# Altium integrated library Electro-Mech.IntLib: 140 symbols
Pins are listed as number, name and electrical type; pins without a type are passive.

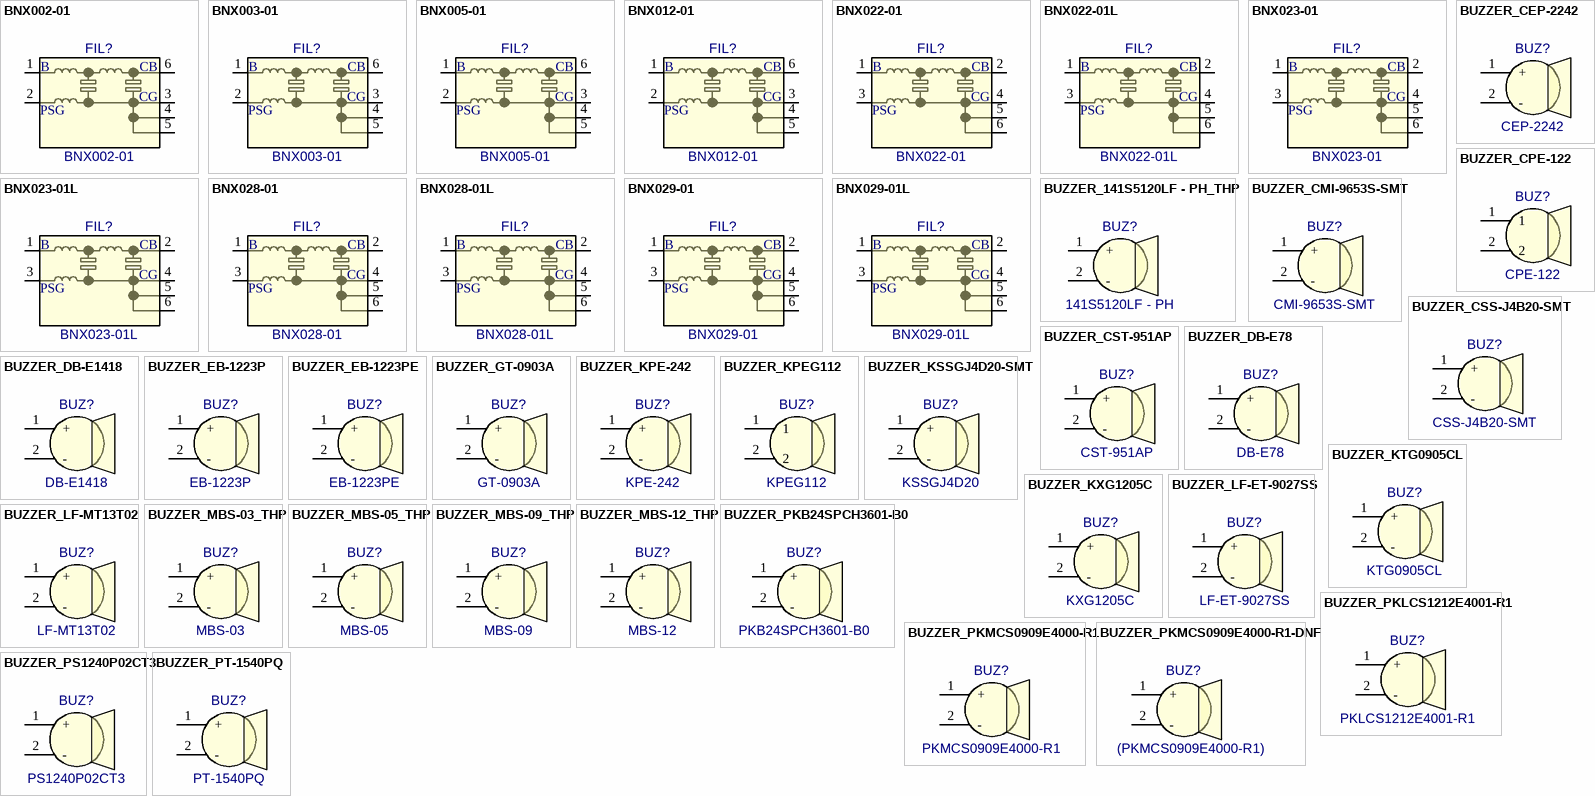
[diagram p0: symbols BNX002-01 to BUZZER_PT-1540PQ]

## BNX002-01
designator FIL?
DC Power Filter 10Amp; Manufacturer: Murata; Reutech PN: 5915-GA-0027; Package: Fil-BNX; EDM-PN: *; Text2: *; Text1: *; Value: BNX002-01; Part Number: BNX002-01
footprint Fil-BNX (Filter BNX 12.0x11.0mm)
pins: 1, 2, 3, 4, 5, 6
text: B; CB; CG; PSG

## BNX003-01
designator FIL?
DC Power Filter 10Amp; Manufacturer: Murata; Package: Fil-BNX; EDM-PN: *; Text2: *; Text1: *; Value: BNX003-01; Part Number: BNX003-01
footprint Fil-BNX (Filter BNX 12.0x11.0mm)
pins: 1, 2, 3, 4, 5, 6
text: B; CB; CG; PSG

## BNX005-01
designator FIL?
DC Power Filter 15Amp; Manufacturer: Murata; Reutech PN: 5915-GA-0071; Package: Fil-BNX; EDM-PN: *; Text2: *; Text1: *; Value: BNX005-01; Part Number: BNX005-01
footprint Fil-BNX (Filter BNX 12.0x11.0mm)
pins: 1, 2, 3, 4, 5, 6
text: B; CB; CG; PSG

## BNX012-01
designator FIL?
DC Power Filter 15Amp 50V; Manufacturer: Murata; Reutech PN: 5915-GA-0076; Package: Fil-BNX012; EDM-PN: *; Text2: *; Text1: *; Value: BNX012-01; Part Number: BNX012-01
footprint Fil-BNX012 (Filter BNX 12.0x11.0mm)
pins: 1, 2, 3, 4, 5, 6
text: B; CB; CG; PSG

## BNX022-01
designator FIL?
DC Power Filter 20Amp 50V; Manufacturer: Murata; Package: BNX02X; EDM-PN: *; Text2: *; Text1: *; Value: BNX022-01; Part Number: BNX022-01
footprint BNX02X (BNX02X 12.1x9.1mm)
pins: 1, 2, 3, 4, 5, 6
text: B; CB; CG; PSG

## BNX022-01L
designator FIL?
DC Power Filter 20Amp 50V; Manufacturer: Murata; Reutech PN: 5915-GA-0069; Package: BNX02X; EDM-PN: *; Text2: *; Text1: *; Value: BNX022-01L; Part Number: BNX022-01L
footprint BNX02X (BNX02X 12.1x9.1mm)
pins: 1, 2, 3, 4, 5, 6
text: B; CB; CG; PSG

## BNX023-01
designator FIL?
DC Power Filter 20Amp 100V; Manufacturer: Murata; Package: BNX02X; EDM-PN: *; Text2: *; Text1: *; Value: BNX023-01; Part Number: BNX023-01
footprint BNX02X (BNX02X 12.1x9.1mm)
pins: 1, 2, 3, 4, 5, 6
text: B; CB; CG; PSG

## BNX023-01L
designator FIL?
DC Power Filter 20Amp 100V; Manufacturer: Murata; Package: BNX02X; EDM-PN: *; Text2: *; Text1: *; Value: BNX023-01L; Part Number: BNX023-01L
footprint BNX02X (BNX02X 12.1x9.1mm)
pins: 1, 2, 3, 4, 5, 6
text: B; CB; CG; PSG

## BNX028-01
designator FIL?
DC Power Filter 20Amp 16V; Manufacturer: Murata; Package: BNX02X; EDM-PN: *; Text2: *; Text1: *; Value: BNX028-01; Part Number: BNX028-01
footprint BNX02X (BNX02X 12.1x9.1mm)
pins: 1, 2, 3, 4, 5, 6
text: B; CB; CG; PSG

## BNX028-01L
designator FIL?
DC Power Filter 20Amp 16V; Manufacturer: Murata; Package: BNX02X; EDM-PN: *; Text2: *; Text1: *; Value: BNX028-01L; Part Number: BNX028-01L
footprint BNX02X (BNX02X 12.1x9.1mm)
pins: 1, 2, 3, 4, 5, 6
text: B; CB; CG; PSG

## BNX029-01
designator FIL?
DC Power Filter 20Amp 6.3V; Manufacturer: Murata; Reutech PN: 5915-GA-0085; Package: BNX02X; EDM-PN: *; Text2: *; Text1: *; Value: BNX029-01; Part Number: BNX029-01
footprint BNX02X (BNX02X 12.1x9.1mm)
pins: 1, 2, 3, 4, 5, 6
text: B; CB; CG; PSG

## BNX029-01L
designator FIL?
DC Power Filter 20Amp 6.3V; Manufacturer: Murata; Package: BNX02X; EDM-PN: *; Text2: *; Text1: *; Value: BNX029-01L; Part Number: BNX029-01L
footprint BNX02X (BNX02X 12.1x9.1mm)
pins: 1, 2, 3, 4, 5, 6
text: B; CB; CG; PSG

## BUZZER_141S5120LF - PH_THP
designator BUZ?, comment 141S5120LF - PH
Buzzer Magnetic 3-18V 8mA; Manufacturer: DB Products; Package: Buzzer-12x9.5mm; EDM-PN: *; Text2: *; Text1: *; Value: 141S5120LF - PH; Part Number: 141S5120LF - PH
footprint Buzzer-12x9.5mm (Buzzer 12.0x9.5mm 7.6mm Pitch)
pins: 1 +, 2 -

## BUZZER_CEP-2242
designator BUZ?, comment CEP-2242
Buzzer Piezo 3-16V 7mA; Manufacturer: CUI; Package: BUZZER-CEP-2242; EDM-PN: *; Text2: *; Text1: *; Value: CEP-2242; Part Number: CEP-2242
footprint BUZZER-CEP-2242 (CEP-2242 13.7x13.7mm)
pins: 1 +, 2 -

## BUZZER_CMI-9653S-SMT
designator BUZ?, comment CMI-9653S-SMT
Buzzer Magnetic 5V 30mA; Manufacturer: CUI; EDM-PN: BUZ25; Package: BUZZER-CMI-9653S-SMT; Text2: *; Text1: *; Value: CMI-9653S-SMT; Part Number: CMI-9653S-SMT
footprint BUZZER-CMI-9653S-SMT (CMI-9653S-SMT  9.6x9.6mm)
pins: 1 +, 2 -

## BUZZER_CPE-122
designator BUZ?, comment CPE-122
Buzzer Piezo 10V 8mA; Manufacturer: CUI; Package: Buzzer-CPE-122; EDM-PN: *; Text2: *; Text1: *; Value: CPE-122; Part Number: CPE-122
footprint Buzzer-CPE-122 (Buzzer CPE-122 10.0mm Pitch)
pins: 1, 2

## BUZZER_CSS-J4B20-SMT
designator BUZ?, comment CSS-J4B20-SMT
Buzzer Magnetic; Manufacturer: CUI; Package: BUZZER-CSS-J4B20-SMT; EDM-PN: *; Text2: *; Text1: *; Value: CSS-J4B20-SMT; Part Number: CSS-J4B20-SMT
footprint CSS-J4B20-SMT (Buzzer CSS-J4B20-SMT 8.5x8.5mm SMT)
pins: 1 +, 2 -

## BUZZER_CST-951AP
designator BUZ?, comment CST-951AP
Buzzer Magnetic 5V 80mA; Manufacturer: CUI; Package: Buzzer-9.0x4.5; EDM-PN: *; Text2: *; Text1: *; Value: CST-951AP; Part Number: CST-951AP
footprint Buzzer-9.0x4.5 (Buzzer 9.0x9.0mm)
pins: 1 +, 2 -

## BUZZER_DB-E78
designator BUZ?, comment DB-E78
Buzzer Piezo 24V 20mA - 7S3240LFLA; Manufacturer: Mantech; Package: BUZZER-29.5x24.5-THRU-PCB; EDM-PN: *; Text2: *; Text1: *; Value: DB-E78; Part Number: DB-E78
footprint BUZZER-29.5x24.5-THRU-PCB
pins: 1 +, 2 -

## BUZZER_DB-E1418
designator BUZ?, comment DB-E1418
Buzzer Magnetic 12V 8mA; Manufacturer: DB; Package: BUZZER-12x9.5mm; EDM-PN: *; Text2: *; Text1: *; Value: DB-E1418; Part Number: DB-E1418
footprint Buzzer-12x9.5mm (Buzzer 12.0x9.5mm 7.6mm Pitch)
pins: 1 +, 2 -

## BUZZER_EB-1223P
designator BUZ?, comment EB-1223P
Buzzer Magnetic 5V 30mA; Manufacturer: eBace/dBace; Package: BUZZER-12x9.5mm; EDM-PN: *; Text2: *; Text1: *; Value: EB-1223P; Part Number: EB-1223P
footprint Buzzer-12x9.5mm (Buzzer 12.0x9.5mm 7.6mm Pitch)
pins: 1 +, 2 -

## BUZZER_EB-1223PE
designator BUZ?, comment EB-1223PE
Buzzer Magnetic 12V 30mA; Manufacturer: eBace/dBace; Package: BUZZER-12x9.5mm; EDM-PN: *; Text2: *; Text1: *; Value: EB-1223PE; Part Number: EB-1223PE
footprint Buzzer-12x9.5mm (Buzzer 12.0x9.5mm 7.6mm Pitch)
pins: 1 +, 2 -

## BUZZER_GT-0903A
designator BUZ?, comment GT-0903A
Buzzer Magnetic 3V 80mA; Manufacturer: Soberton; Package: Buzzer-9.0x4.5; EDM-PN: *; Text2: *; Text1: *; Value: GT-0903A; Part Number: GT-0903A
footprint Buzzer-9.0x4.5 (Buzzer 9.0x9.0mm)
pins: 1 +, 2 -

## BUZZER_KPE-242
designator BUZ?, comment KPE-242
Buzzer Piezo 3-16V 7mA; Manufacturer: Kingstate; Package: BUZZER-KPE-242; EDM-PN: *; Text2: *; Text1: *; Value: KPE-242; Part Number: KPE-242
footprint BUZZER-KPE-242 (KPE-242 13.7x13.7mm)
pins: 1 +, 2 -

## BUZZER_KPEG112
designator BUZ?, comment KPEG112
Buzzer Piezo Max 30VAC 11mA; Manufacturer: Kingstate; Package: Buzzer-KPEG112; EDM-PN: *; Text2: *; Text1: *; Value: KPEG112; Part Number: KPEG112
footprint Buzzer-KPEG112 (Buzzer KPEG112 10.0mm Pitch)
pins: 1, 2

## BUZZER_KSSGJ4D20-SMT
designator BUZ?, comment KSSGJ4D20
Buzzer Magnetic; Manufacturer: Kingstate; Package: BUZZER-KSSGJ4D20; EDM-PN: *; Text2: *; Text1: *; Value: KSSGJ4D20; Part Number: KSSGJ4D20
footprint BUZZER-KSSGJ4D20 (Buzzer KSSGJ4D20 8.5x8.5mm SMT)
pins: 1 +, 2 -

## BUZZER_KTG0905CL
designator BUZ?, comment KTG0905CL
Buzzer Magnetic 5V 30mA; Manufacturer: Kingstate; Package: BUZZER-KTG0905CL; EDM-PN: *; Text2: *; Text1: *; Value: KTG0905CL; Part Number: KTG0905CL
footprint BUZZER-KTG0905CL (KTG0905CL  9.6x9.6mm)
pins: 1 +, 2 -

## BUZZER_KXG1205C
designator BUZ?, comment KXG1205C
Buzzer Magnetic 5V 30mA; Manufacturer: Kingstate; Package: BUZZER-12x9.5mm; EDM-PN: *; Text2: *; Text1: *; Value: KXG1205C; Part Number: KXG1205C
footprint Buzzer-12x9.5mm (Buzzer 12.0x9.5mm 7.6mm Pitch)
pins: 1 +, 2 -

## BUZZER_LF-ET-9027SS
designator BUZ?, comment LF-ET-9027SS
Buzzer 3V 80mA; Manufacturer: dBace Electronic; Package: BUZZER-LF-ET-9027SS; EDM-PN: *; Text2: *; Text1: *; Value: LF-ET-9027SS; Part Number: LF-ET-9027SS
footprint BUZZER-ET-9027SS (BUZZER-ET-9027SS 10.6x12.4mm)
pins: 1 +, 2 -

## BUZZER_LF-MT13T02
designator BUZ?, comment LF-MT13T02
Buzzer 5V 40mA; Manufacturer: Ariose Electonics; Package: BUZZER-LF-MT13T02; EDM-PN: *; Text2: *; Text1: *; Value: LF-MT13T02; Part Number: LF-MT13T02
footprint BUZZER-LF-MT13T02 (LF-MT13T02 12.8x12.8mm)
pins: 1 +, 2 -

## BUZZER_MBS-03_THP
designator BUZ?, comment MBS-03
Buzzer Magnetic 3V 30mA; Manufacturer: KAYER INDUSTRIAL; EDM-PN: BUZ1; Value: MBS-03_THP; Package: Buzzer-12x9.5mm; Text2: *; Text1: *; Part Number: MBS-03
footprint Buzzer-12x9.5mm (Buzzer 12.0x9.5mm 7.6mm Pitch)
pins: 1 +, 2 -

## BUZZER_MBS-05_THP
designator BUZ?, comment MBS-05
Buzzer Magnetic 5V 30mA; Manufacturer: KAYER INDUSTRIAL; Package: Buzzer-12x9.5mm; EDM-PN: *; Text2: *; Text1: *; Value: MBS-05; Part Number: MBS-05
footprint Buzzer-12x9.5mm (Buzzer 12.0x9.5mm 7.6mm Pitch)
pins: 1 +, 2 -

## BUZZER_MBS-09_THP
designator BUZ?, comment MBS-09
Buzzer Magnetic 9V 30mA; Manufacturer: KAYER INDUSTRIAL; Package: Buzzer-12x9.5mm; EDM-PN: *; Text2: *; Text1: *; Value: MBS-09; Part Number: MBS-09
footprint Buzzer-12x9.5mm (Buzzer 12.0x9.5mm 7.6mm Pitch)
pins: 1 +, 2 -

## BUZZER_MBS-12_THP
designator BUZ?, comment MBS-12
Buzzer Magnetic 12V 30mA; Manufacturer: KAYER INDUSTRIAL; Package: Buzzer-12x9.5mm; EDM-PN: *; Text2: *; Text1: *; Value: MBS-12; Part Number: MBS-12
footprint Buzzer-12x9.5mm (Buzzer 12.0x9.5mm 7.6mm Pitch)
pins: 1 +, 2 -

## BUZZER_PKB24SPCH3601-B0
designator BUZ?, comment PKB24SPCH3601-B0
Buzzer Piezoelectric 12V; Manufacturer: Murata; Package: PKB24SPCH3601-B0; EDM-PN: *; Text2: *; Text1: *; Value: PKB24SPCH3601-B0; Part Number: PKB24SPCH3601-B0
footprint PKB24SPCH3601-B0 (PKB24SPCH3601-B0 24.3mm)
pins: 1 +, 2 -

## BUZZER_PKLCS1212E4001-R1
designator BUZ?, comment PKLCS1212E4001-R1
Buzzer Piezoelectric; Manufacturer: Murata; Package: PKLCS1212E4001-R1; EDM-PN: *; Text2: *; Text1: *; Value: PKLCS1212E4001-R1; Part Number: PKLCS1212E4001-R1
footprint PKLCS1212E4001-R1 (Buzzer 12.0x12.0mm SMD)
pins: 1 +, 2 -

## BUZZER_PKMCS0909E4000-R1
designator BUZ?, comment Part Number: PKMCS0909E4000-R1  (hidden comment: PKLCS1212E4001-R1)
Buzzer Piezoelectric; Manufacturer: Murata; Value: PKMCS0909E4000-R1; Package: PKMCS0909E4000-R1; EDM-PN: *; Text2: *; Text1: *
footprint PKMCS0909E4000-R1 (Buzzer 9.0x9.0mm SMD)
pins: 1 +, 2 -

## BUZZER_PKMCS0909E4000-R1-DNF
designator BUZ?, comment value (PKMCS0909E4000-R1)  (hidden comment: PKLCS1212E4001-R1-DNF)
Buzzer Piezoelectric - Do not Fit; Manufacturer: Murata; Part Number: DNF - PKMCS0909E4000-R1; Package: PKMCS0909E4000-R1; EDM-PN: *; Text2: *; Text1: *
footprint PKMCS0909E4000-R1 (Buzzer 9.0x9.0mm SMD)
pins: 1 +, 2 -

## BUZZER_PS1240P02CT3
designator BUZ?, comment PS1240P02CT3
Buzzer Piezoelectric; Manufacturer: TDK; Package: PS1240P02CT3; EDM-PN: *; Text2: *; Text1: *; Value: PS1240P02CT3; Part Number: PS1240P02CT3
footprint PS1240P02CT3 (PS1240P02CT3 12.2x12.2mm)
pins: 1 +, 2 -

## BUZZER_PT-1540PQ
designator BUZ?, comment PT-1540PQ
Buzzer Piezo Transducer 5.0V; Manufacturer: Mallory; Package: Buzzer-PT-1540PQ; EDM-PN: *; Text2: *; Text1: *; Value: PT-1540PQ; Part Number: PT-1540PQ
footprint Buzzer-PT-1540PQ (PT-1540PQ 17.0x9.0mm 10mm Pitch)
pins: 1 +, 2 -

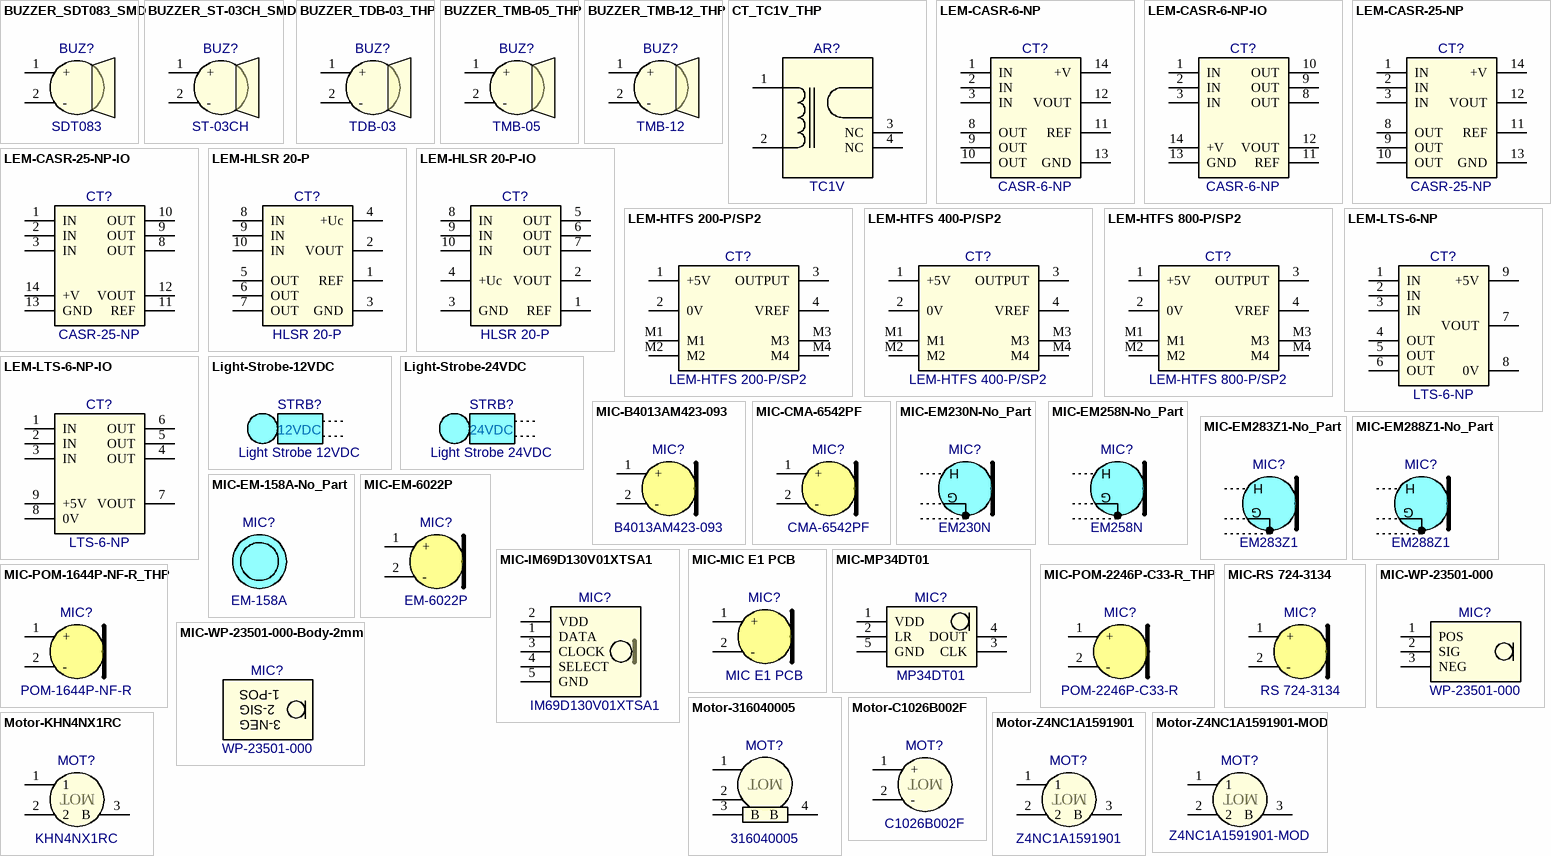
[diagram p1: symbols BUZZER_SDT083_SMD to Motor-Z4NC1A1591901-MOD]

## BUZZER_SDT083_SMD
designator BUZ?, comment SDT083
Magnetic Transducer; Manufacturer: DB Products; Package: BUZZER-SDT083; EDM-PN: *; Text2: *; Text1: *; Value: SDT083; Part Number: SDT083
footprint BUZZER-SDT083 (Buzzer SDT083 8.5x8.5mm SMT)
pins: 1 +, 2 -

## BUZZER_ST-03CH_SMD
designator BUZ?, comment ST-03CH
Magnetic Transducer; Manufacturer: Soberton; Package: BUZZER-ST-03CH; EDM-PN: *; Text2: *; Text1: *; Value: ST-03CH; Part Number: ST-03CH
footprint BUZZER-ST-03CH (Buzzer ST-03CH 8.5x8.5mm SMT)
pins: 1 +, 2 -

## BUZZER_TDB-03_THP
designator BUZ?, comment Part Number: TDB-03  (hidden comment: TDB-03PN)
Buzzer Magnetic; Manufacturer: Various; EDM-PN: BUZ10; Value: TDB-03; Package: Buzzer-12x9.5mm; Text2: *; Text1: *
footprint Buzzer-12x9.5mm (Buzzer 12.0x9.5mm 7.6mm Pitch)
pins: 1 +, 2 -

## BUZZER_TMB-05_THP
designator BUZ?, comment TMB-05
Buzzer Magnetic; Manufacturer: Star Micronics; Package: Buzzer-12x9.5mm; EDM-PN: *; Text2: *; Text1: *; Value: TMB-05; Part Number: TMB-05
footprint Buzzer-12x9.5mm (Buzzer 12.0x9.5mm 7.6mm Pitch)
pins: 1 +, 2 -

## BUZZER_TMB-12_THP
designator BUZ?, comment TMB-12
Buzzer Magnetic; Manufacturer: Star Micronics; Package: Buzzer-12x9.5mm; EDM-PN: *; Text2: *; Text1: *; Value: TMB-12; Part Number: TMB-12
footprint Buzzer-12x9.5mm (Buzzer 12.0x9.5mm 7.6mm Pitch)
pins: 1 +, 2 -

## CT_TC1V_THP
designator AR?, comment TC1V
Transformer Current High Prcision Vertical PCB Mount; Manufacturer: FORWARD RELAYS; Value: CT_TC1V_THP; Package: TC1V_THP; EDM-PN: *; Text2: *; Text1: *; Part Number: TC1V
footprint TC1V-THP (Current Transformer, Straight THP)
pins: 1, 2, 3 NC, 4 NC

## LEM-CASR-6-NP
designator CT?  Part Number: CASR-6-NP  (hidden comment: LEM-CASR-6-NP)
Current Transducer; Manufacturer: LEM; Reutech PN: 5963-CM-0012; Package: LEM-CASR; EDM-PN: *; Text2: *; Text1: *; Value: LEM-CASR-6-NP
footprint LEM-CASR (LEM CASR 21.91x13.4mm)
pins: 1 IN, 2 IN, 3 IN, 8 OUT, 9 OUT, 10 OUT, 11 REF, 12 VOUT, 13 GND, 14 +V

## LEM-CASR-6-NP-IO
designator CT?  Part Number: CASR-6-NP  (hidden comment: LEM-CASR-6-NP-IO)
Current Transducer; Manufacturer: LEM; Reutech PN: 5963-CM-0012; Package: LEM-CASR; EDM-PN: *; Text2: *; Text1: *; Value: LEM-CASR-6-NP
footprint LEM-CASR (LEM CASR 21.91x13.4mm)
pins: 1 IN, 2 IN, 3 IN, 8 OUT, 9 OUT, 10 OUT, 11 REF, 12 VOUT, 13 GND, 14 +V

## LEM-CASR-25-NP
designator CT?  Part Number: CASR-25-NP  (hidden comment: LEM-CASR-25-NP)
Current Transducer; Manufacturer: LEM; Reutech PN: 5963-CM-0014; Package: LEM-CASR; EDM-PN: *; Text2: *; Text1: *; Value: LEM-CASR-25-NP
footprint LEM-CASR (LEM CASR 21.91x13.4mm)
pins: 1 IN, 2 IN, 3 IN, 8 OUT, 9 OUT, 10 OUT, 11 REF, 12 VOUT, 13 GND, 14 +V

## LEM-CASR-25-NP-IO
designator CT?  Part Number: CASR-25-NP  (hidden comment: LEM-CASR-25-NP-IO)
Current Transducer; Manufacturer: LEM; Reutech PN: 5963-CM-0014; Package: LEM-CASR; EDM-PN: *; Text2: *; Text1: *; Value: LEM-CASR-25-NP
footprint LEM-CASR (LEM CASR 21.91x13.4mm)
pins: 1 IN, 2 IN, 3 IN, 8 OUT, 9 OUT, 10 OUT, 11 REF, 12 VOUT, 13 GND, 14 +V

## LEM-HLSR 20-P
designator CT?  Part Number: HLSR 20-P  (hidden comment: LEM-HLSR 20-P)
Current Transducer; Manufacturer: LEM; Package: LEM-HLSR-P; EDM-PN: *; Text2: *; Text1: *; Value: HLSR 20-P
footprint LEM-HLSR-P (LEM CASR 17.2x21.6mm)
pins: 1 REF, 2 VOUT, 3 GND, 4 +Uc, 5 OUT, 6 OUT, 7 OUT, 8 IN, 9 IN, 10 IN

## LEM-HLSR 20-P-IO
designator CT?  Part Number: HLSR 20-P  (hidden comment: LEM-HLSR 20-P-IO)
Current Transducer; Manufacturer: LEM; Package: LEM-HLSR-P; EDM-PN: *; Text2: *; Text1: *; Value: HLSR 20-P
footprint LEM-HLSR-P (LEM CASR 17.2x21.6mm)
pins: 1 REF, 2 VOUT, 3 GND, 4 +Uc, 5 OUT, 6 OUT, 7 OUT, 8 IN, 9 IN, 10 IN

## LEM-HTFS 200-P/SP2
designator CT?
Current Transducer; Manufacturer: LEM; Package: LEM-HTFS-2-4-8; EDM-PN: *; Text2: *; Text1: *; Value: LEM-HTFS 200-P/SP2; Part Number: LEM-HTFS 200-P/SP2
footprint LEM-HTFS-2-4-8
pins: 1 +5V, 2 0V, 3 OUTPUT, 4 VREF, M1, M2, M3, M4

## LEM-HTFS 400-P/SP2
designator CT?
Current Transducer; Manufacturer: LEM; Package: LEM-HTFS-2-4-8; EDM-PN: *; Text2: *; Text1: *; Value: LEM-HTFS 400-P/SP2; Part Number: LEM-HTFS 400-P/SP2
footprint LEM-HTFS-2-4-8
pins: 1 +5V, 2 0V, 3 OUTPUT, 4 VREF, M1, M2, M3, M4

## LEM-HTFS 800-P/SP2
designator CT?
Current Transducer; Manufacturer: LEM; Package: LEM-HTFS-2-4-8; EDM-PN: *; Text2: *; Text1: *; Value: LEM-HTFS 800-P/SP2; Part Number: LEM-HTFS 800-P/SP2
footprint LEM-HTFS-2-4-8
pins: 1 +5V, 2 0V, 3 OUTPUT, 4 VREF, M1, M2, M3, M4

## LEM-LTS-6-NP
designator CT?  Part Number: LTS-6-NP  (hidden comment: LEM-LTS-6-NP)
Current Transducer; Manufacturer: LEM; Package: LEM-LTS-6-NP; EDM-PN: *; Text2: *; Text1: *; Value: LTS-6-NP
footprint LEM-LTS-6-NP (LEM-6-NP 22.2x10mm)
pins: 1 IN, 2 IN, 3 IN, 4 OUT, 5 OUT, 6 OUT, 7 VOUT, 8 0V, 9 +5V

## LEM-LTS-6-NP-IO
designator CT?  Part Number: LTS-6-NP  (hidden comment: LEM-LTS-6-NP-IO)
Current Transducer; Manufacturer: LEM; Package: LEM-LTS-6-NP; EDM-PN: *; Text2: *; Text1: *; Value: LTS-6-NP
footprint LEM-LTS-6-NP (LEM-6-NP 22.2x10mm)
pins: 1 IN, 2 IN, 3 IN, 4 OUT, 5 OUT, 6 OUT, 7 VOUT, 8 0V, 9 +5V

## Light-Strobe-12VDC
designator STRB?  value 12VDC  (hidden comment: Light-Strobe-12VDC)  (mechanical)
Light Strobe 12VDC; Manufacturer: Various; Package: NA; EDM-PN: *; Text2: *; Text1: *; Part Number: Light Strobe 12VDC

## Light-Strobe-24VDC
designator STRB?  value 24VDC  (hidden comment: Light-Strobe-24VDC)  (mechanical)
Light Strobe 24VDC; Manufacturer: Various; Package: NA; EDM-PN: *; Text2: *; Text1: *; Part Number: Light Strobe 24VDC

## MIC-B4013AM423-093
designator MIC?, comment B4013AM423-093
Microphone Electret Condenser  100Hz-10kHz (-42dB ±3dB @ 94dB SPL); Manufacturer: LSCS/Geotek; Package: MIC-B4013AM423-093; EDM-PN: *; Text2: *; Text1: *; Value: B4013AM423-093; Part Number: B4013AM423-093
footprint MIC-B4013AM423-093 (B4013AM423-093 4.0x4.0mm)
pins: 1 +, 2 -

## MIC-CMA-6542PF
designator MIC?, comment CMA-6542PF
Microphone 4.5V; Manufacturer: CUI; Package: MIC-CMA-6542PF; EDM-PN: *; Text2: *; Text1: *; Value: CMA-6542PF; Part Number: CMA-6542PF
footprint MIC-CMA-6542PF (CMA-6542PF 9.7x9.7mm)
pins: 1 +, 2 -

## MIC-EM230N-No_Part
designator MIC?, comment EM230N  (mechanical)
Microphone Electret Condenser 3V -51dB; Manufacturer: Primo; EDM-PN: MIC17; Package: NA; Text2: *; Text1: *; Value: EM230N; Part Number: EM230N
text: H; G

## MIC-EM258N-No_Part
designator MIC?, comment EM258N  (mechanical)
Microphone Electret Condenser 3V -32dB; Manufacturer: Primo; EDM-PN: MIC14; Package: NA; Text2: *; Text1: *; Value: EM258N; Part Number: EM258N
text: H; G

## MIC-EM283Z1-No_Part
designator MIC?, comment EM283Z1  (mechanical)
Microphone Electret Condenser 3V -39dB; Manufacturer: Primo; EDM-PN: MIC16; Package: NA; Text2: *; Text1: *; Value: EM283Z1; Part Number: EM283Z1
text: H; G

## MIC-EM288Z1-No_Part
designator MIC?, comment EM288Z1  (mechanical)
Microphone Electret Condenser 2V -43dB; Manufacturer: Primo; EDM-PN: MIC13; Package: NA; Text2: *; Text1: *; Value: EM288Z1; Part Number: EM288Z1
text: H; G

## MIC-EM-158A-No_Part
designator MIC?, comment EM-158A  (mechanical)
Microphone Rubber Holder; Manufacturer: Primo; EDM-PN: MIC15; Package: NA; Text2: *; Text1: *; Value: EM-158A; Part Number: EM-158A

## MIC-EM-6022P
designator MIC?, comment EM-6022P
Microphone Condenser Omni-Directional 1-10V; Manufacturer: Soberton; Package: MIC-EM-6022P; EDM-PN: *; Text2: *; Text1: *; Value: EM-6022P; Part Number: EM-6022P
footprint MIC-EM-6022P (EM-6022P PCB 6x6mm)
pins: 1 +, 2 -

## MIC-IM69D130V01XTSA1
designator MIC?, comment IM69D130V01XTSA1
Microphone 20Hz ~ 20kHz Digital, PDM MEM - 1.62-3.6V; Manufacturer: Infineon; Package: MIC-IM69D130V01XTSA1; EDM-PN: *; Text2: *; Text1: *; Value: IM69D130V01XTSA1; Part Number: IM69D130V01XTSA1
footprint MIC-IM69D130V01XTSA1 (IM69D130V01XTSA1 3.0x4.0mm)
pins: 1 DATA, 2 VDD (power), 3 CLOCK, 4 SELECT, 5 GND (power)

## MIC-MIC E1 PCB
designator MIC?, comment MIC E1 PCB
Microphone Condenser Omni-Directional 1.5-15V; Manufacturer: Communica; Package: MIC E1 PCB; EDM-PN: *; Text2: *; Text1: *; Value: MIC E1 PCB; Part Number: MIC E1 PCB
footprint MIC E1 PCB (MIC E1 PCB 10x10mm)
pins: 1 +, 2 -

## MIC-MP34DT01
designator MIC?, comment MP34DT01
Microphone MEMS Digital; Manufacturer: ST; EDM-PN: MIC10; Package: MIC-MP34DT01; Text2: *; Text1: *; Value: MP34DT01; Part Number: MP34DT01
footprint MIC-MP34DT01 (MP34DT01 3x4mm)
pins: 1 VDD, 2 LR, 3 CLK, 4 DOUT, 5 GND

## MIC-POM-1644P-NF-R_THP
designator MIC?, comment POM-1644P-NF-R
Microphone 2-10V 0.5mA; Manufacturer: PUIAUDIO; Package: POM-1644P-NF-R; EDM-PN: *; Text2: *; Text1: *; Value: POM-1644P-NF-R; Part Number: POM-1644P-NF-R
footprint POM-1644P-NF-R (POM-1644P-NF-R 6.0x6.0mm)
pins: 1 +, 2 -
